# Altium footprint library Footprints.PcbLib: 236 footprints (part 6 of 15)
Each footprint in its own frame and in the unit in brackets; x right, y up, seen from the top. Pads: shape width x height; smd on the part's side, far side on the other; paste and mask are expansions set on the pad; w line width, h text height; cw(c..) or ccw(c..) is an arc to the next point about the centre after c.
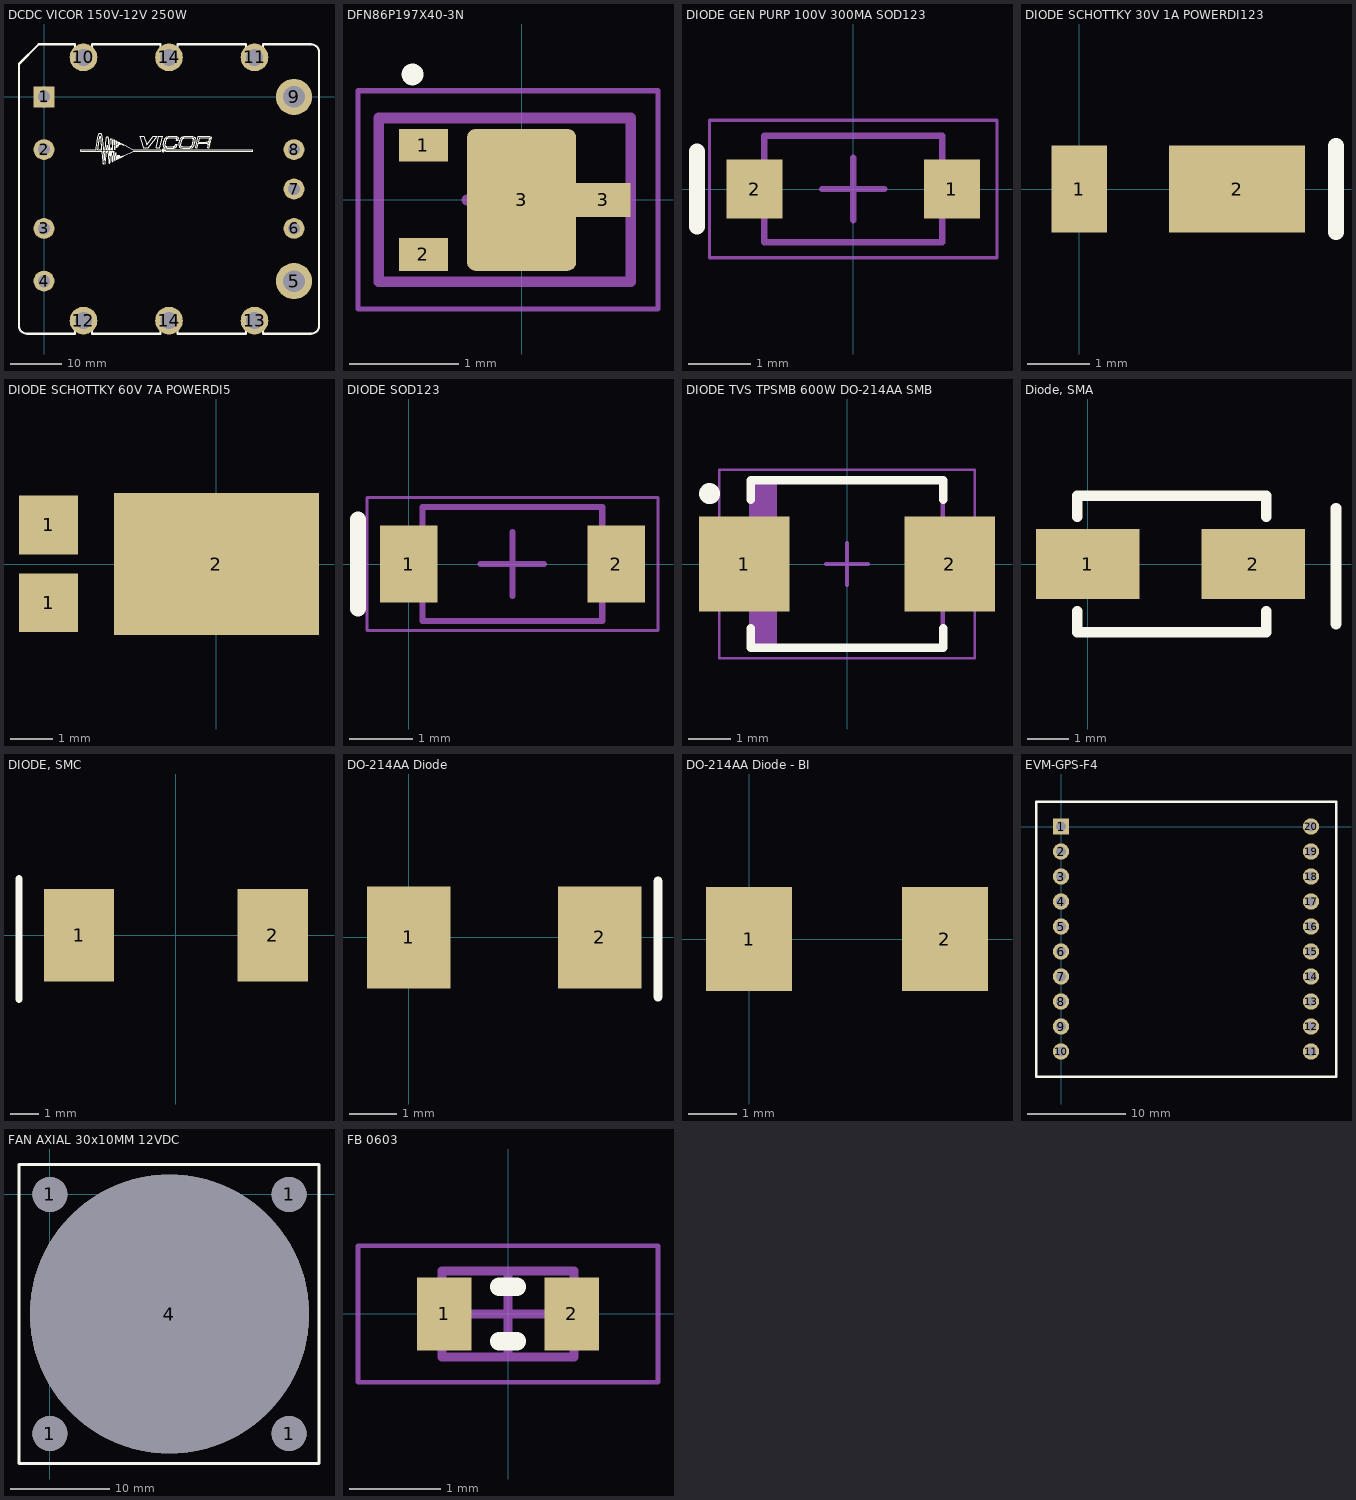
[diagram p5: the footprints below, top view; thin cyan lines are the x and y axes]

## DCDC VICOR 150V-12V 250W [mm]
pads (15):
  rect 4x4 hole 2.39: 1(0,0)
  round 4 hole 2.39: 2(0,-10.16) 3(0,-25.4) 4(0,-35.56) 6(48.26,-25.4) 7(48.26,-17.78) 8(48.26,-10.16)
  round 7 hole 4.16: 5(48.26,-35.56) 9(48.26,0)
  round 5.334 hole 3.302: 10(7.62,7.62) 11(40.64,7.62) 12(7.62,-43.18) 13(40.64,-43.18) 14(24.13,-43.18) 14(24.13,7.62)
Top Overlay:
  drawing of 1161 lines, arcs and shapes, not listed
Mechanical 1:
  circle w0.076: c0,0 r1.905
  circle w0.076: c0,0 r1.194
  circle w0.076: c0,0 r1.016
  lines w0.076: -4.826,-44.196 ccw(c-3.302,-44.196) -3.302,-45.72 5.982,-45.72 5.982,-43.18 cw(c7.62,-43.18) 9.258,-43.18 9.258,-45.72 22.492,-45.72 22.492,-43.18 cw(c24.13,-43.18) 25.768,-43.18 25.768,-45.72 39.002,-45.72 39.002,-43.18 cw(c40.64,-43.18) 42.278,-43.18 42.278,-45.72 51.562,-45.72 ccw(c51.562,-44.196) 53.086,-44.196 53.086,8.636 ccw(c51.562,8.636) 51.562,10.16 42.278,10.16 42.278,7.62 cw(c40.64,7.62) 39.002,7.62 39.002,10.16 25.768,10.16 25.768,7.62 cw(c24.13,7.62) 22.492,7.62 22.492,10.16 9.258,10.16 9.258,7.62 cw(c7.62,7.62) 5.982,7.62 5.982,10.16 -1.016,10.16 -4.826,6.35 -4.826,-44.196
Mechanical 2:
  circle w0.076: c0,0 r1.905
  circle w0.076: c0,0 r1.194
  circle w0.076: c0,0 r1.016
Drill Drawing:
  circle w0.076: c0,0 r1.194
3D body "37206r1-VxxBxxxxxxBLP.STP": height 11.44, standoff -4.63, extent -5.08,-45.888 53.006,10.16

## DFN86P197X40-3N [mm] "DFN, 3-Leads, Body 1.47x1.97mm, Pitch 0.86mm, IPC Medium Density"
height 0.4
pads (4):
  rect 0.45x0.3 smd: 1(-0.9,0.5) 2(-0.9,-0.5)
  rrect15% 1x1.3 smd: 3(0,0)
  rect 0.5x0.31 smd: 3(0.75,0)
Top Overlay:
  circle w0.1: c-1,1.15 r0.05
Mechanical 13:
  lines w0.1: -1.31,-0.75 1,-0.75 1,0.75 -1.31,0.75 -1.31,-0.75
Mechanical 15:
  lines w0.05: -1.5,-1 1.25,-1 1.25,1 -1.5,1 -1.5,-1
  lines w0.1: -0.5,0 0.5,0 ; 0,-0.5 0,0.5
3D body "DFN86P197X40-3N.step": height 0.4, standoff 0, extent -1.31,-0.75 1,0.75

## DIODE GEN PURP 100V 300MA SOD123 [mm] "Diode Standard 100V 300mA (DC) Surface Mount SOD-123"
height 1.35
pads (2):
  rect 0.9x0.95 smd: 1(1.58,0) 2(-1.58,0)
Top Overlay:
  lines w0.254: -2.5,-0.6 -2.5,0.6
Mechanical 13:
  lines w0.1: -1.425,-0.85 -1.425,0.85 1.425,0.85 1.425,-0.85 -1.425,-0.85
Mechanical 15:
  lines w0.05: -2.3,-1.1 -2.3,1.1 2.3,1.1 2.3,-1.1 -2.3,-1.1
  lines w0.1: -0.5,0 0.5,0 ; 0,-0.5 0,0.5
3D body "SOD-123_J.stp": height 1.23, standoff -0.03, extent -1.854,-0.775 1.854,0.775

## DIODE SCHOTTKY 30V 1A POWERDI123 [mm] "Diodes Incorporated DFLS130L-7"
height 1
pads (2):
  rect 0.9x1.4 smd: 1(0,0)
  rect 2.2x1.4 smd: 2(2.55,0)
Top Overlay:
  lines w0.254: 4.15,-0.7 4.15,0.7
3D body "PowerDI123.stp": height 0.98, standoff 0, extent -0.274,-0.88 3.424,0.9

## DIODE SCHOTTKY 60V 7A POWERDI5 [mm] "Diode Schottky 60V 7A Surface Mount PowerDI?5"
pads (3):
  rect 1.4x1.39 smd: 1(-3.975,-0.915) 1(-3.975,0.925)
  rect 4.86x3.36 smd: 2(0,0)

## DIODE SOD123 [mm]
pads (2):
  rect 0.91x1.22 smd: 1(0,0) 2(3.28,0)
Top Overlay:
  lines w0.254: -0.8,-0.7 -0.8,0.7
Mechanical 13:
  lines w0.1: 0.22,-0.9 0.22,0.9 3.06,0.9 3.06,-0.9 0.22,-0.9
Mechanical 15:
  lines w0.05: -0.66,-1.05 -0.66,1.05 3.94,1.05 3.94,-1.05 -0.66,-1.05
  lines w0.1: 1.14,0 2.14,0 ; 1.64,-0.5 1.64,0.5
3D body "SOD-123_J.stp": height 1.23, standoff -0.03, extent -0.214,-0.775 3.494,0.775

## DIODE TVS TPSMB 600W DO-214AA SMB [mm] "Littlefuse TPSMB"
height 2.44
pads (2):
  rect 2.16x2.26 smd: 1(-2.451,0) 2(2.451,0)
Top Overlay:
  circle w0.25: c-3.281,1.68 r0.125
  lines w0.2: -2.3,-1.53 -2.3,-2 2.3,-2 2.3,-1.53 ; -2.3,1.53 -2.3,2 2.3,2 2.3,1.53
Mechanical 13:
  rectangle: -2.285,-1.97 -1.67,1.97
  lines w0.1: -2.285,-1.97 -2.285,1.97 2.285,1.97 2.285,-1.97 -2.285,-1.97
Mechanical 15:
  lines w0.05: -3.05,-2.25 -3.05,2.25 3.05,2.25 3.05,-2.25 -3.05,-2.25
  lines w0.1: -0.5,0 0.5,0 ; 0,-0.5 0,0.5
3D body "DIODE TVS TPSMB 600W DO-214AA SMB.step": height 2.44, standoff 0, extent -2.505,-1.97 2.505,1.97

## Diode, SMA [mm]
pads (2):
  rect 2.5x1.7 smd: 1(0,0) 2(4,0)
Top Overlay:
  lines w0.254: -0.254,-1.143 -0.254,-1.651 4.318,-1.651 4.318,-1.143 ; -0.254,1.143 -0.254,1.651 4.318,1.651 4.318,1.143 ; 6,-1.45 6,1.344
3D body "Diode SMA.stp": height 2.41, standoff 0, extent -0.69,-1.45 4.59,1.47

## DIODE, SMC [mm]
pads (2):
  rect 2.5x3.3 smd: 1(-3.45,0) 2(3.45,0)
Top Overlay:
  lines w0.254: -5.588,-2.286 -5.588,2.032
3D body "DO-214AC.stp": height 2.25, standoff -0.04, extent -2.74,-1.524 2.54,1.266

## DO-214AA Diode [mil] "Zener Diode 16V 5W SMBJ5353B-TP"
pads (2):
  rect 70x85 smd: 1(0,0) 2(160,0)
Top Overlay:
  lines w7.87: 208.66,-49.76 208.66,47.24
3D body "Diode SMA.stp": height 94.95, standoff 0, extent -21.26,-59.85 186.61,55.12

## DO-214AA Diode - BI [mil] "Zener Diode 16V 5W SMBJ5353B-TP"
pads (2):
  rect 70x85 smd: 1(0,0) 2(160,0)
3D body "Diode SMA.stp": height 94.95, standoff 0, extent -21.26,-59.84 186.61,55.12

## ENCLOSURE PC 120X120X70 BOTTOM [mm]
3D body "1557DABK _BOTTOM.step": height 0, standoff -15, extent -60,-60 60,60

## ENCLOSURE PC 120X120X70 TOP [mm]
3D body "1557DABK_TOP.step": height 70, standoff 13.8, extent -59.986,-59.986 59.986,59.986

## EVM-GPS-F4 [mil] "GPS Module"
pads (20):
  rect 65x65 hole 40: 1(0,0)
  round 65 hole 40: 2(0,-100) 3(0,-200) 4(0,-300) 5(0,-400) 6(0,-500) 7(0,-600) 8(0,-700) 9(0,-800) 10(0,-900) 11(1000,-900) 12(1000,-800) 13(1000,-700) 14(1000,-600) 15(1000,-500) 16(1000,-400) 17(1000,-300) 18(1000,-200) 19(1000,-100) 20(1000,0)
Top Overlay:
  lines w10: -100,-1000 1100,-1000 1100,100 -100,100 -100,-1000

## FAN AXIAL 30x10MM 12VDC [mm]
pads (5):
  round 3.5 hole 3.5: 1(0,-24) 1(0,0) 1(24,-24) 1(24,0)
  round 28 hole 28: 4(12,-12)
Top Overlay:
  lines w0.254: -3.099,-27 27,-27 27,3 -3.099,3 -3.099,-27
3D body "ASB0312LA-CF00.stp": height 10.05, standoff -0.1, extent -3.099,-27 27,3

## FB 0603 [mm] "Ferrite Bead, 0603"
height 0.95
pads (2):
  rect 0.6x0.8 smd: 1(-0.7,0) 2(0.7,0)
Top Overlay:
  lines w0.2: -0.1,-0.3 0.1,-0.3 ; -0.1,0.3 0.1,0.3
Assembly Top (Mech9):
  lines w0.1: -0.725,-0.475 -0.725,0.475 0.725,0.475 0.725,-0.475 -0.725,-0.475
Courtyard Top (Mech11):
  lines w0.05: -1.65,-0.75 -1.65,0.75 1.65,0.75 1.65,-0.75 -1.65,-0.75
  lines w0.1: -0.475,0 0.475,0 ; 0,-0.475 0,0.475
3D body "FB 0603.step": height 0.95, standoff 0, extent -0.725,-0.475 0.725,0.475